# Altium footprint library Nhat_Lib.PcbLib: 84 footprints (part 4 of 6)
Each footprint in its own frame and in the unit in brackets; x right, y up, seen from the top. Pads: shape width x height; smd on the part's side, far side on the other; paste and mask are expansions set on the pad; w line width, h text height; cw(c..) or ccw(c..) is an arc to the next point about the centre after c.
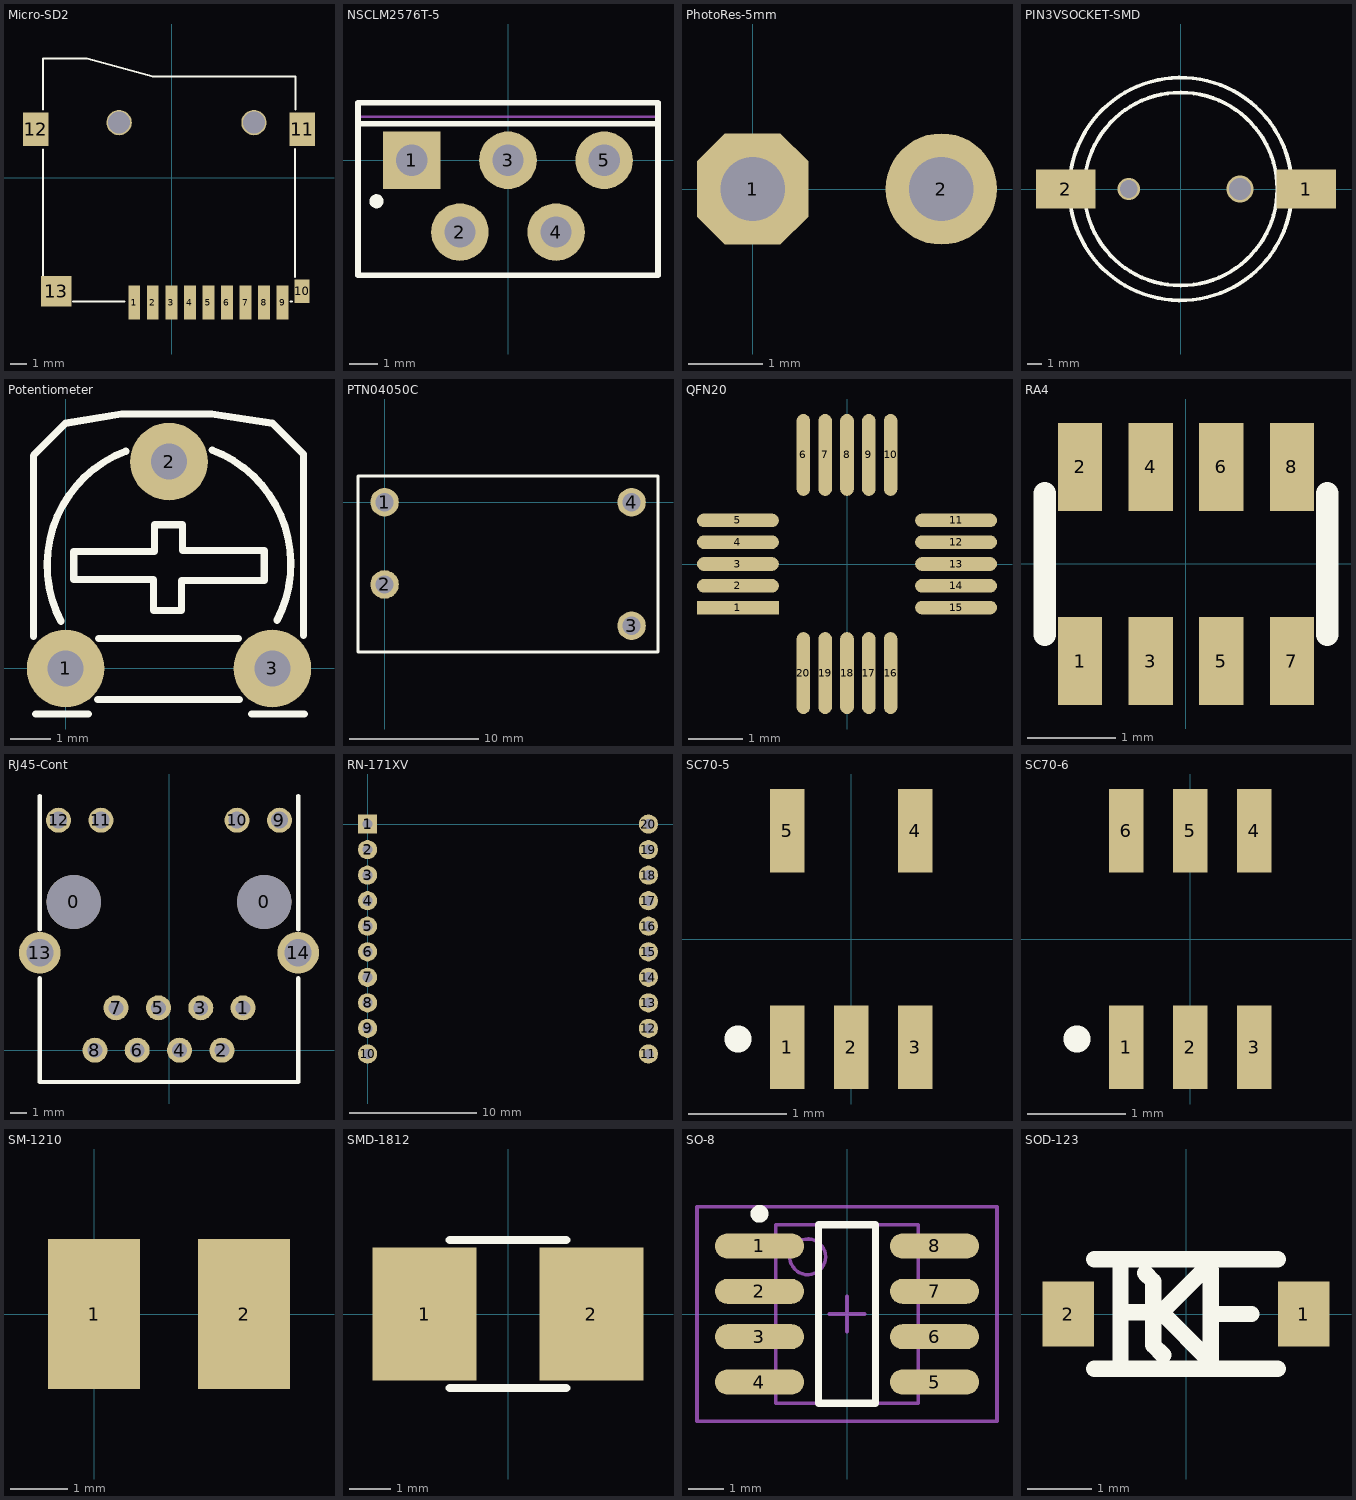
[diagram p3: the footprints below, top view; thin cyan lines are the x and y axes]

## Micro-SD2 [mm]
pads (15):
  rect 0.7x2 smd: 1(-2.225,-7.4) 2(-1.125,-7.4) 3(-0.025,-7.4) 4(1.075,-7.4) 5(2.175,-7.4) 6(3.275,-7.4) 7(4.375,-7.4) 8(5.475,-7.4) 9(6.575,-7.4)
  rect 0.9x1.4 smd: 10(7.735,-6.725)
  rect 1.5x2 smd: 11(7.735,2.875) 12(-8.065,2.875)
  rect 1.8x1.8 smd: 13(-6.85,-6.725)
  round 1.5 hole 1.3: ""(-3.125,3.275) ""(4.875,3.275)
Top Overlay:
  lines w0.127: -7.645,-5.817 -7.645,1.676 ; -7.645,4.064 -7.645,7.075 -5.025,7.075 -1.125,6.02 7.341,6.02 7.341,4.064 ; -5.867,-7.341 -2.819,-7.341 ; 7.061,-7.341 7.137,-7.341 ; 7.315,-5.867 7.315,1.702

## NSCLM2576T-5 [mil]
pads (5):
  rect 80x80 hole 43.31: 1(-133.86,0)
  round 80 hole 43.31: 2(-66.93,-100) 3(0,0) 4(66.93,-100) 5(133.86,0)
Top Overlay:
  circle w9.84: c-183.07,-57.09 r4.92
  lines w7.87: -208.66,50.55 208.66,50.55 ; -208.66,-160 -208.66,80 208.66,80 208.66,-160 -208.66,-160
Mechanical 13:
  lines w3.94: -208.66,60.55 208.66,60.55 ; -208.66,-160 208.66,-160 208.66,80 -208.66,80 -208.66,-160
3D body: height 771.65, standoff 511.81, extent -208.66,60.18 208.62,79.82

## PhotoRes-5mm [mm] "Photoresistor 5mm"
pads (2):
  oct 1.5x1.5 hole 0.864: 1(0,0)
  round 1.5 hole 0.864: 2(2.54,0)
3D body: height 4, standoff -2, extent -0.976,-2.373 3.524,2.627

## PIN3VSOCKET-SMD [mm]
pads (2):
  rect 4x2.6 smd: 1(8.46,0) 2(-7.74,0)
via 4,0 diameter 1.8 hole 1.5
via -3.5,0 diameter 1.5 hole 1.2
Top Overlay:
  circle w0.254: c0,0 r6.5
  circle w0.254: c0,0 r7.5
3D body: height 3.94, standoff -1, extent -8.742,-7.493 9.758,7.504

## Potentiometer [mil]
pads (3):
  round 75 hole 35: 1(0,0) 2(100,200) 3(200,0)
Top Overlay:
  lines w7: -31,31 -31,206 0,237 54,246 141.5,246 200,237 230,207 230,32 ; -29,-44 22,-44 ; -4.35,45.34 cw(c100,100) 58.1,210.1 ; 8,113 8,86 85,86 85,56 112,56 112,85 192,85 192,114 113,114 113,139 86,139 86,113 9,113 ; 31,-30 168,-30 ; 32,29 167,29 ; 141.9,211.1 cw(c100,101) 204.35,46.34 ; 180,-44 231,-44
3D body: height 295.28, standoff -133.86, extent -30,-38.78 225.9,238.78

## PTN04050C [mm]
pads (4):
  round 2.2 hole 1.4: 1(0,0) 2(0,-6.34) 3(19.06,-9.52) 4(19.06,0)
Top Overlay:
  lines w0.254: -2.05,2 -2.05,-11.55 21.09,-11.55 ; -2.03,2.03 21.09,2.03 ; 21.1,-11.55 21.1,2
3D body: height 8.05, standoff 0, extent -1.75,-11.2 20.75,1.7

## QFN20 [mm]
pads (20):
  rect 1.5x0.25 smd: 1(-2,-0.8)
  oval 1.5x0.25 smd: 2(-2,-0.4) 3(-2,0) 4(-2,0.4) 5(-2,0.8) 11(2,0.8) 12(2,0.4) 13(2,0) 14(2,-0.4) 15(2,-0.8)
  oval 0.25x1.5 smd: 6(-0.8,2) 7(-0.4,2) 8(0,2) 9(0.4,2) 10(0.8,2) 16(0.8,-2) 17(0.4,-2) 18(0,-2) 19(-0.4,-2) 20(-0.8,-2)
3D body: height 0.62, standoff -0.08, extent -1.476,-1.5 1.524,1.5

## RA4 [mm] "Resistor Array (0603x4) form TME"
pads (8):
  rect 0.5x1 smd: 1(-1.2,-1.1) 2(-1.2,1.1) 3(-0.4,-1.1) 4(-0.4,1.1) 5(0.4,-1.1) 6(0.4,1.1) 7(1.2,-1.1) 8(1.2,1.1)
Top Overlay:
  lines w0.254: -1.6,-0.8 -1.6,0.8 ; 1.6,-0.8 1.6,0.8
3D body: height 0.5, standoff 0, extent -1.6,-0.8 1.6,0.8

## RJ45-Cont [mm]
pads (16):
  round 3.25 hole 3.25: 0(-5.715,8.89) 0(5.715,8.89)
  round 1.5 hole 0.89: 1(4.445,2.54) 2(3.175,0) 3(1.905,2.54) 4(0.635,0) 5(-0.635,2.54) 6(-1.905,0) 7(-3.175,2.54) 8(-4.445,0)
  round 1.5 hole 1.02: 9(6.625,13.79) 10(4.085,13.79) 11(-4.085,13.79) 12(-6.625,13.79)
  round 2.5 hole 1.63: 13(-7.745,5.84) 14(7.745,5.84)
Top Overlay:
  lines w0.254: -7.747,4.318 -7.747,-1.905 7.745,-1.905 ; -7.747,7.239 -7.747,15.24 ; 7.747,-1.905 7.747,4.318 ; 7.747,7.239 7.747,15.24
3D body: height 14, standoff -2.5, extent -7.94,-1.588 7.94,19.812

## RN-171XV [mm]
pads (20):
  rect 1.5x1.5 hole 0.8: 1(0,0)
  round 1.5 hole 0.8: 2(0,-2) 3(0,-4) 4(0,-6) 5(0,-8) 6(0,-10) 7(0,-12) 8(0,-14) 9(0,-16) 10(0,-18) 11(21.996,-18) 12(21.996,-16) 13(21.996,-14) 14(21.996,-12) 15(21.996,-10) 16(21.996,-8) 17(21.996,-6) 18(21.996,-4) 19(21.996,-2) 20(21.996,0)

## SC70-5 [mm]
pads (5):
  rect 0.35x0.85 smd: 1(-0.65,-1.1) 2(0,-1.1) 3(0.65,-1.1) 4(0.65,1.1) 5(-0.65,1.1)
Top Overlay:
  circle w0.254: c-1.153,-1.016 r0.01
3D body: height 0.95, standoff 0, extent -1,-1.05 1,1.05

## SC70-6 [mm]
pads (6):
  rect 0.35x0.85 smd: 1(-0.65,-1.1) 2(0,-1.1) 3(0.65,-1.1) 4(0.65,1.1) 5(0,1.1) 6(-0.65,1.1)
Top Overlay:
  circle w0.254: c-1.153,-1.016 r0.01
3D body: height 0.92, standoff -0.03, extent -1,-1.05 1,1.05

## SM-1210 [mm]
pads (2):
  rect 1.6x2.6 smd: 1(0,0) 2(2.6,0)
3D body: height 0.74, standoff -0.04, extent -0.304,-1.25 2.896,1.25

## SMD-1812 [mm] "1.1AFuse"
pads (2):
  rect 2.5x3.2 smd: 1(-2,0) 2(2,0)
Top Overlay:
  lines w0.2: -1.397,-1.778 1.397,-1.778 ; -1.397,1.778 1.397,1.778
3D body: height 1.34, standoff 0, extent -2.365,-1.705 2.365,1.705

## SO-8 [mm]
pads (8):
  oval 2.5x0.7 smd: 1(-2.45,1.905) 2(-2.45,0.635) 3(-2.45,-0.635) 4(-2.45,-1.905) 5(2.45,-1.905) 6(2.45,-0.635) 7(2.45,0.635) 8(2.45,1.905)
Top Overlay:
  circle w0.25: c-2.45,2.805 r0.125
  lines w0.2: -0.8,-2.5 0.8,-2.5 0.8,2.5 -0.8,2.5 -0.8,-2.5
Mechanical 13:
  circle w0.1: c-1.1,1.6 r0.5
  lines w0.1: -2,-2.5 2,-2.5 2,2.5 -2,2.5 -2,-2.5
Mechanical 15:
  lines w0.1: -0.5,0 0.5,0 ; 0,-0.5 0,0.5 ; -4.2,-3 4.2,-3 4.2,3 -4.2,3 -4.2,-3
3D body: height 1.75, standoff 0, extent -3,-2.45 3,2.45

## SOD-123 [mm]
pads (2):
  rect 0.8x1 smd: 1(1.825,0) 2(-1.825,0)
Top Overlay:
  lines w0.254: -1.425,-0.85 1.425,-0.85 ; -1.425,0.85 1.425,0.85 ; -1.016,-0.85 -1.016,0.85 ; -0.889,0.025 -0.635,0.025 ; -0.635,0.635 -0.508,0.508 -0.508,-0.483 -0.356,-0.635 ; 0.305,0.711 -0.381,0.025 0.381,-0.737 0.381,0.686 ; 0.533,0 1.016,0
3D body: height 1.42, standoff -0.03, extent -1.925,-0.836 1.925,0.864